# Altium footprint library my Library.PcbLib: 1247 footprints (part 50 of 78)
Each footprint in its own frame and in the unit in brackets; x right, y up, seen from the top. Pads: shape width x height; smd on the part's side, far side on the other; paste and mask are expansions set on the pad; w line width, h text height; cw(c..) or ccw(c..) is an arc to the next point about the centre after c.
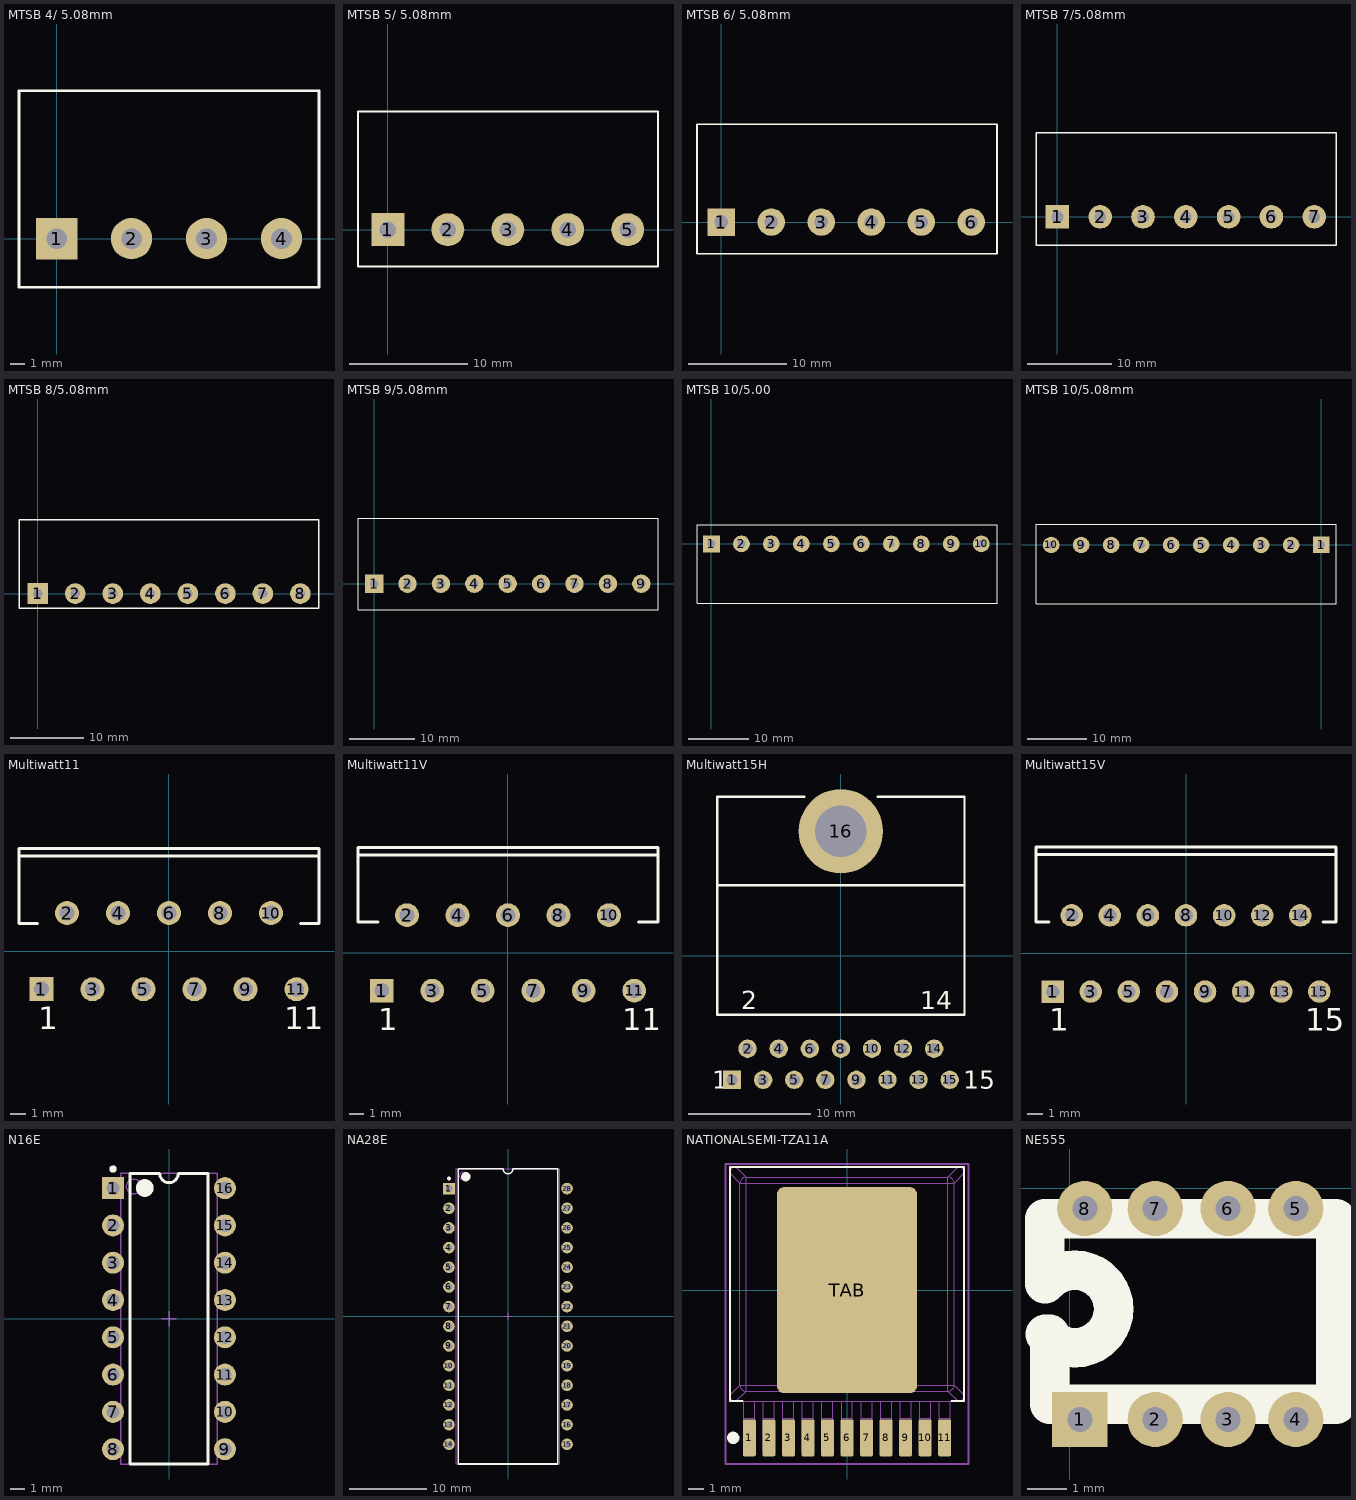
[diagram p49: the footprints below, top view; thin cyan lines are the x and y axes]

## MTSB 4/ 5.08mm [mil]
pads (4):
  rect 110x110 hole 55.12: 1(0,0)
  round 110 hole 55.12: 2(200,0) 3(400,0) 4(600,0)
Top Overlay:
  lines w7: -100.5,-130 700,-130 700,395 -100.5,395 -100.5,-130
3D body "User Library-MSTB 2,5-4-G-5,08 1759033.STEP": height 339.19, standoff -137.19, extent -99.5,-79 700.5,393.53

## MTSB 5/ 5.08mm [mil]
pads (5):
  rect 110x110 hole 55.12: 1(0,0)
  round 110 hole 55.12: 2(200,0) 3(400,0) 4(600,0) 5(800,0)
Top Overlay:
  lines w7: -99.5,-122.5 901,-122.5 901,393.5 898.5,393.5 -99.5,393.5 -99.5,-122.5
3D body "User Library-MSTB 2,5-5-G-5,08 1759046.STEP": height 339.18, standoff -137.2, extent -99.5,-78.77 900.5,393.77

## MTSB 6/ 5.08mm [mil]
pads (6):
  rect 110x110 hole 55.12: 1(0,0)
  round 110 hole 55.12: 2(200,0) 3(400,0) 4(600,0) 5(800,0) 6(1000,0)
Top Overlay:
  lines w7: -97,-127 1103,-127 1103,391.5 -97,391.5 -97,-127
3D body "User Library-MSTB 2,5-6-G-5,08 1759059.STEP": height 339.18, standoff -137.2, extent -99.5,-77.77 1100.5,394.77

## MTSB 7/5.08mm [mil]
pads (7):
  rect 110x110 hole 55.12: 1(0,0)
  round 110 hole 55.12: 2(200,0) 3(400,0) 4(600,0) 5(800,0) 7(1200,0)
  round 110 hole 50: 6(1000,0)
Top Overlay:
  lines w7: -100,-133.07 -100,393.5 1302,393.5 1302,-133.07 -100,-133.07
3D body "User Library-MSTB 2,5-7-G-5,08 1759062.STEP": height 339.18, standoff -137.2, extent -99.5,-79 1300.5,393.53

## MTSB 8/5.08mm [mil]
pads (8):
  rect 110x110 hole 50: 1(0,0)
  round 110 hole 50: 2(200,0) 3(400,0) 4(600,0) 5(800,0) 6(1000,0) 7(1200,0) 8(1400,0)
Top Overlay:
  lines w7: -100,-79.5 -100,394.5 1499.5,394.5 1499.5,-79.5 -100,-79.5
3D body "User Library-MSTB 2,5-8-G-5,08 1759075.STEP": height 339.18, standoff -137.2, extent -99.5,-78.5 1500.5,394.03

## MTSB 9/5.08mm [mil]
pads (9):
  rect 110x110 hole 50: 1(0,0)
  round 110 hole 50: 2(200,0) 3(400,0) 4(600,0) 5(800,0) 6(1000,0) 7(1200,0) 8(1400,0) 9(1600,0)
Top Overlay:
  lines w7: -96.5,-155.51 -96.5,392 1700,392 1700,-155.51 -96.5,-155.51
3D body "User Library-MSTB 2,5-9-G-5,08 1759088.STEP": height 339.18, standoff -137.2, extent -99.5,-79.5 1700.5,393.03

## MTSB 10/5.00 [mil]
pads (10):
  rect 110x110 hole 50: 1(0,0)
  round 110 hole 50: 2(196.85,0) 3(393.7,0) 4(590.55,0) 5(787.4,0) 6(984.25,0) 8(1377.95,0) 9(1574.8,0) 10(1771.65,0)
  round 110 hole 39.37: 7(1181.1,0)
Top Overlay:
  lines w7: -95,-391 1874.5,-391 1874.5,127.17 -95,127.17 -95,-391
3D body "User Library-MSTB 2,5-10-G 1754591.STEP": height 339.18, standoff -137.2, extent -94,-390.94 1874.5,81.5

## MTSB 10/5.08mm [mil]
pads (10):
  rect 110x110 hole 50: 1(0,0)
  round 110 hole 50: 2(-200,0) 3(-400,0) 4(-600,0) 5(-800,0) 6(-1000,0) 7(-1200,0) 8(-1400,0) 9(-1600,0) 10(-1800,0)
Top Overlay:
  lines w7: -1901,-393 -1901,139.37 99.5,139.37 99.5,79.5 99.5,-393 -1901,-393
3D body "User Library-MSTB 2,5-10-G-5,08 1759091.STEP": height 339.18, standoff -137.2, extent -1900.5,-393.03 99.5,79.5

## Multiwatt11 [mm] "TO, Thru-Hole, Vertical, Heatsink Mounted; 11 Bent Staggered Leads; Pitch 1.7 mm"
height 21
pads (11):
  rect 1.6x1.6 hole 1: 1(-8.5,-2.54)
  round 1.6 hole 1: 2(-6.8,2.54) 3(-5.1,-2.54) 4(-3.4,2.54) 5(-1.7,-2.54) 6(0,2.54) 7(1.7,-2.54) 8(3.4,2.54) 9(5.1,-2.54) 10(6.8,2.54) 11(8.5,-2.54)
Top Overlay:
  lines w0.2: -10,6.33 9.9,6.33 ; -8.754,1.83 -10,1.83 -10,6.83 10,6.83 10,1.83 8.774,1.83
  text "11" at 7.67,-5.215 h1.5
  text "1" at -8.73,-5.215 h1.5

## Multiwatt11V [mm] "TO, Thru-Hole, Vertical, Heatsink Mounted; 11 Bent Staggered Leads; Pitch 1.7 mm"
height 21
pads (11):
  rect 1.6x1.6 hole 1: 1(-8.5,-2.54)
  round 1.6 hole 1: 2(-6.8,2.54) 3(-5.1,-2.54) 4(-3.4,2.54) 5(-1.7,-2.54) 6(0,2.54) 7(1.7,-2.54) 8(3.4,2.54) 9(5.1,-2.54) 10(6.8,2.54) 11(8.5,-2.54)
Top Overlay:
  lines w0.2: -10.1,6.59 10.1,6.59 ; -8.754,2.09 -10.1,2.09 -10.1,7.09 10.1,7.09 10.1,2.09 8.774,2.09
  text "1" at -8.73,-5.215 h1.5
  text "11" at 7.69,-5.215 h1.5

## Multiwatt15H [mm] "TO, Thru-Hole, Horizontal, Heatsink Mounted; 15 Bent Staggered Leads; Pitch 1.27 mm"
height 5
pads (16):
  rect 1.5x1.5 hole 0.9: 1(-8.89,-10.155)
  round 1.5 hole 0.9: 2(-7.62,-7.615) 3(-6.35,-10.155) 4(-5.08,-7.615) 5(-3.81,-10.155) 6(-2.54,-7.615) 7(-1.27,-10.155) 8(0,-7.615) 9(1.27,-10.155) 10(2.54,-7.615) 11(3.81,-10.155) 12(5.08,-7.615) 13(6.35,-10.155) 14(7.62,-7.615) 15(8.89,-10.155)
  round 6.9 hole 4.2: 16(0,10.155)
Top Overlay:
  lines w0.2: -10.1,5.755 10.1,5.755 ; -3,12.955 -10.1,12.955 -10.1,-4.845 10.1,-4.845 10.1,12.955 3,12.955
  text "2" at -8.12,-4.37 h1.5
  text "14" at 6.495,-4.37 h1.5
  text "15" at 10.015,-10.905 h1.5
  text "1" at -10.515,-10.905 h1.5

## Multiwatt15V [mm] "TO, Thru-Hole, Vertical, Heatsink Mounted; 15 Bent Staggered Leads; Pitch 1.27 mm"
height 21
pads (15):
  rect 1.5x1.5 hole 0.9: 1(-8.89,-2.54)
  round 1.5 hole 0.9: 2(-7.62,2.54) 3(-6.35,-2.54) 4(-5.08,2.54) 5(-3.81,-2.54) 6(-2.54,2.54) 7(-1.27,-2.54) 8(0,2.54) 9(1.27,-2.54) 10(2.54,2.54) 11(3.81,-2.54) 12(5.08,2.54) 13(6.35,-2.54) 14(7.62,2.54) 15(8.89,-2.54)
Top Overlay:
  lines w0.2: -10,6.59 10,6.59 ; -9.144,2.09 -10,2.09 -10,7.09 10,7.09 10,2.09 9.144,2.09
  text "1" at -9.12,-5.165 h1.5
  text "15" at 7.94,-5.165 h1.5
3D body "User Library-Multiwatt15V.STEP": height 1, standoff -21.3, extent -9.8,-2.778 9.8,7.112

## N16E [mm] "DIP, 16-Leads, Row Spacing 7.62mm, Pitch 2.54mm, Body 19.3x6.35mm"
height 4.32
pads (16):
  rect 1.5x1.5 hole 0.9: 1(-3.81,8.89)
  round 1.5 hole 0.9: 2(-3.81,6.35) 3(-3.81,3.81) 4(-3.81,1.27) 5(-3.81,-1.27) 6(-3.81,-3.81) 7(-3.81,-6.35) 8(-3.81,-8.89) 9(3.81,-8.89) 10(3.81,-6.35) 11(3.81,-3.81) 12(3.81,-1.27) 13(3.81,1.27) 14(3.81,3.81) 15(3.81,6.35) 16(3.81,8.89)
Top Overlay:
  circle w0.6: c-1.65,8.9 r0.3
  circle w0.25: c-3.81,10.19 r0.125
  lines w0.2: -2.65,-9.9 2.65,-9.9 2.65,9.9 0.635,9.9 cw(c0,9.9) -0.635,9.9 -2.65,9.9 -2.65,-9.9
Mechanical 13:
  circle w0.1: c-2.4,9 r0.5
  lines w0.1: -3.3,-9.9 3.3,-9.9 3.3,9.9 -3.3,9.9 -3.3,-9.9
Mechanical 15:
  lines w0.1: -0.5,0 0.5,0 ; 0,-0.5 0,0.5
3D body: height 4.32, standoff 0, extent -3.3,-9.9 3.3,9.9

## NA28E [mm] "DIP, 28-Leads, Row Spacing 15.24mm, Pitch 2.54mm, Body 36.83x13.72mm"
height 4.83
pads (28):
  rect 1.5x1.5 hole 0.9: 1(-7.62,16.51)
  round 1.5 hole 0.9: 2(-7.62,13.97) 3(-7.62,11.43) 4(-7.62,8.89) 5(-7.62,6.35) 6(-7.62,3.81) 7(-7.62,1.27) 8(-7.62,-1.27) 9(-7.62,-3.81) 10(-7.62,-6.35) 11(-7.62,-8.89) 12(-7.62,-11.43) 13(-7.62,-13.97) 14(-7.62,-16.51) 15(7.62,-16.51) 16(7.62,-13.97) 17(7.62,-11.43) 18(7.62,-8.89) 19(7.62,-6.35) 20(7.62,-3.81) 21(7.62,-1.27) 22(7.62,1.27) 23(7.62,3.81) 24(7.62,6.35) 25(7.62,8.89) 26(7.62,11.43) 27(7.62,13.97) 28(7.62,16.51)
Top Overlay:
  circle w0.25: c-7.62,17.81 r0.125
  circle w0.6: c-5.45,18.05 r0.3
  lines w0.2: -6.45,-19.05 -6.45,19.05 -0.635,19.05 ccw(c0,19.05) 0.635,19.05 6.45,19.05 6.45,-19.05 -6.45,-19.05
Mechanical 13:
  circle w0.1: c-5.775,18.15 r0.5
  lines w0.1: -6.675,-19.05 -6.675,19.05 6.675,19.05 6.675,-19.05 -6.675,-19.05
Mechanical 15:
  lines w0.1: -0.5,0 0.5,0 ; 0,-0.5 0,0.5
3D body: height 4.83, standoff 0, extent -6.675,-19.05 6.675,19.05

## NATIONALSEMI-TZA11A [mm] "National Semi TZA11A package"
height 6
pads (12):
  rrect25% 0.85x2.4 smd: 1(-6.35,-9.6) 2(-5.08,-9.6) 3(-3.81,-9.6) 4(-2.54,-9.6) 5(-1.27,-9.6) 6(0,-9.6) 7(1.27,-9.6) 8(2.54,-9.6) 9(3.81,-9.6) 10(5.08,-9.6) 11(6.35,-9.6)
  rrect10% 9.1x13.4 smd: TAB(0,0)
Top Overlay:
  circle w0.4: c-7.4,-9.6 r0.2
  lines w0.127: -6.8,-7.2 -7.6,-7.2 -7.6,8 7.6,8 7.6,-7.2 6.8,-7.2
Mechanical 13:
  lines w0.05: -6.705,-9.644 -5.995,-9.644 ; -6.705,-9.29 -5.995,-9.29 ; -6.705,-8.865 -5.995,-8.865 ; -6.705,-8.325 -5.995,-8.325 ; -6.705,-7.235 -6.705,-10.515 -5.995,-10.515 -5.995,-7.235 ; -5.435,-9.644 -4.725,-9.644 ; -5.435,-9.29 -4.725,-9.29 ; -5.435,-8.865 -4.725,-8.865 ; -5.435,-8.325 -4.725,-8.325 ; -5.435,-7.235 -5.435,-10.515 -4.725,-10.515 -4.725,-7.235 ; -4.165,-9.644 -3.455,-9.644 ; -4.165,-9.29 -3.455,-9.29 ; -4.165,-8.865 -3.455,-8.865 ; -4.165,-8.325 -3.455,-8.325 ; -4.165,-7.235 -4.165,-10.515 -3.455,-10.515 -3.455,-7.235 ; -2.895,-9.644 -2.185,-9.644 ; -2.895,-9.29 -2.185,-9.29 ; -2.895,-8.865 -2.185,-8.865 ; -2.895,-8.325 -2.185,-8.325 ; -2.895,-7.235 -2.895,-10.515 -2.185,-10.515 -2.185,-7.235 ; -1.625,-9.644 -0.915,-9.644 ; -1.625,-9.29 -0.915,-9.29 ; -1.625,-8.865 -0.915,-8.865 ; -1.625,-8.325 -0.915,-8.325 ; -1.625,-7.235 -1.625,-10.515 -0.915,-10.515 -0.915,-7.235 ; -0.355,-9.644 0.355,-9.644 ; -0.355,-9.29 0.355,-9.29 ; -0.355,-8.865 0.355,-8.865 ; -0.355,-8.325 0.355,-8.325 ; -0.355,-7.235 -0.355,-10.515 0.355,-10.515 0.355,-7.235 ; 0.915,-9.644 1.625,-9.644 ; 0.915,-9.29 1.625,-9.29 ; 0.915,-8.865 1.625,-8.865 ; 0.915,-8.325 1.625,-8.325 ; 0.915,-7.235 0.915,-10.515 1.625,-10.515 1.625,-7.235 ; 2.185,-9.644 2.895,-9.644 ; 2.185,-9.29 2.895,-9.29 ; 2.185,-8.865 2.895,-8.865 ; 2.185,-8.325 2.895,-8.325 ; 2.185,-7.235 2.185,-10.515 2.895,-10.515 2.895,-7.235 ; 3.455,-9.644 4.165,-9.644 ; 3.455,-9.29 4.165,-9.29 ; 3.455,-8.865 4.165,-8.865 ; 3.455,-8.325 4.165,-8.325 ; 3.455,-7.235 3.455,-10.515 4.165,-10.515 4.165,-7.235 ; 4.725,-9.644 5.435,-9.644 ; 4.725,-9.29 5.435,-9.29 ; 4.725,-8.865 5.435,-8.865 ; 4.725,-8.325 5.435,-8.325 ; 4.725,-7.235 4.725,-10.515 5.435,-10.515 5.435,-7.235 ; 5.995,-9.644 6.705,-9.644 ; 5.995,-9.29 6.705,-9.29 ; 5.995,-8.865 6.705,-8.865 ; 5.995,-8.325 6.705,-8.325 ; 5.995,-7.235 5.995,-10.515 6.705,-10.515 6.705,-7.235 ; -7.625,-6.839 ccw(c-7.225,-6.835) -7.229,-7.235 ; -7.625,-6.839 -6.958,-6.172 ; -7.625,-6.839 -7.625,-6.835 -7.625,7.615 -7.625,7.619 ; -7.625,7.619 cw(c-7.225,7.615) -7.229,8.015 ; -7.625,7.619 -6.958,6.952 ; -7.229,-7.235 -6.562,-6.568 ; -7.229,-7.235 -7.225,-7.235 7.225,-7.235 7.229,-7.235 ; -7.229,8.015 -6.562,7.348 ; -7.229,8.015 -7.225,8.015 7.225,8.015 7.229,8.015 ; -6.958,-6.172 ccw(c-6.553,-6.163) -6.562,-6.568 ; -6.958,-6.172 6.958,-6.172 ; -6.958,-6.172 -6.958,6.952 ; -6.958,6.952 cw(c-6.553,6.943) -6.562,7.348 ; -6.958,6.952 6.958,6.952 ; -6.562,-6.568 6.562,-6.568 ; -6.562,-6.568 -6.562,7.348 ; -6.562,7.348 6.562,7.348 ; 6.562,-6.568 ccw(c6.553,-6.163) 6.958,-6.172 ; 6.562,-6.568 6.562,7.348 ; 6.562,-6.568 7.229,-7.235 ; 6.562,7.348 cw(c6.553,6.943) 6.958,6.952 ; 6.562,7.348 7.229,8.015 ; 6.958,-6.172 6.958,6.952 ; 6.958,-6.172 7.625,-6.839 ; 6.958,6.952 7.625,7.619 ; 7.229,-7.235 ccw(c7.225,-6.835) 7.625,-6.839 ; 7.229,8.015 cw(c7.225,7.615) 7.625,7.619 ; 7.625,-6.839 7.625,-6.835 7.625,7.615 7.625,7.619
Mechanical 15:
  lines w0.127: -7.9,-11.3 7.9,-11.3 7.9,8.2 -7.9,8.2 -7.9,-11.3
3D body "NATIONALSEMI-TZA11A.STEP": height 6, standoff 0, extent -7.625,-10.515 7.625,8.015

## NE555 [mm]
pads (8):
  rect 1.395x1.395 hole 0.635: 1(0.254,-5.842)
  round 1.395 hole 0.635: 2(2.159,-5.842) 3(4,-5.842) 4(5.715,-5.842) 5(5.715,-0.508) 6(4,-0.508) 7(2.159,-0.508) 8(0.381,-0.508)
Top Overlay:
  lines w1: -0.635,-2.413 -0.635,-0.762 6.731,-0.762 6.731,-1.937 6.731,-4.286 6.731,-5.461 -0.508,-5.461 -0.508,-3.683 ; -0.62,-3.683 ccw(c0.127,-3.048) -0.62,-2.413
3D body "User Library-NE55N.STEP": height 3.47, standoff -3.93, extent -0.825,-5.969 7.175,-0.398